# Altium footprint library ICPOWER.PcbLib: 71 footprints (part 3 of 5)
Each footprint in its own frame and in the unit in brackets; x right, y up, seen from the top. Pads: shape width x height; smd on the part's side, far side on the other; paste and mask are expansions set on the pad; w line width, h text height; cw(c..) or ccw(c..) is an arc to the next point about the centre after c.
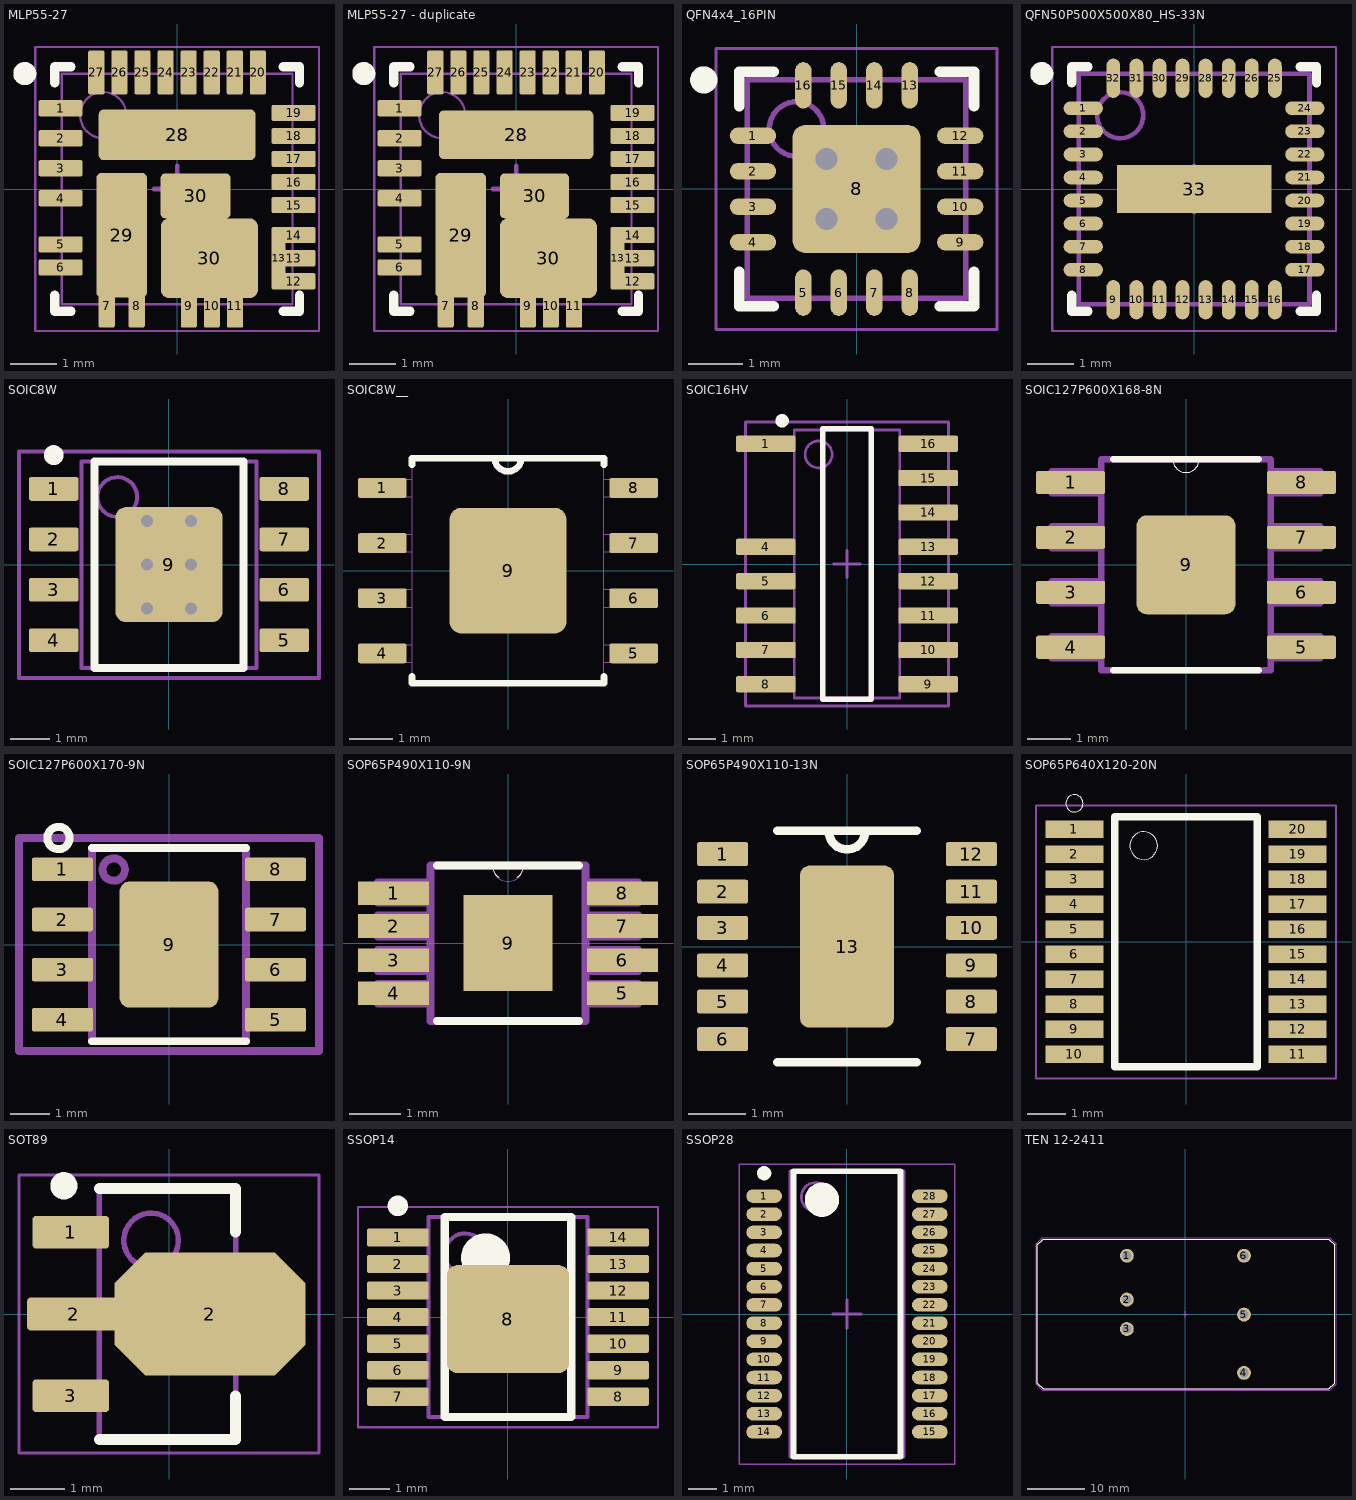
[diagram p2: the footprints below, top view; thin cyan lines are the x and y axes]

## MLP55-27 [mm] "SiC461, SiC462, SiC463, SiC464"
height 0.8
pads (32):
  rrect20% 0.95x0.35 smd: 1(-2.525,1.75) 2(-2.525,1.1) 3(-2.525,0.45) 4(-2.525,-0.2) 5(-2.525,-1.2) 6(-2.525,-1.7) 12(2.525,-2) 13(2.525,-1.5) 14(2.525,-1) 15(2.525,-0.35) 16(2.525,0.15) 17(2.525,0.65) 18(2.525,1.15) 19(2.525,1.65)
  rrect20% 0.35x0.95 smd: 7(-1.525,-2.525) 8(-0.875,-2.525) 9(0.255,-2.525) 10(0.755,-2.525) 11(1.255,-2.525) 20(1.75,2.525) 21(1.25,2.525) 22(0.75,2.525) 23(0.25,2.525) 24(-0.25,2.525) 25(-0.75,2.525) 26(-1.25,2.525) 27(-1.75,2.525)
  rrect20% 0.3x1.35 smd: 13(2.2,-1.5)
  rrect20% 3.4x1.1 smd: 28(0,1.175)
  rrect20% 1.1x2.7 smd: 29(-1.2,-1)
  rrect20% 1.52x0.97 smd: 30(0.4,-0.15)
  rrect20% 2.1x1.73 smd: 30(0.7,-1.5)
Top Overlay:
  circle w0.25: c-3.3,2.5 r0.125
  lines w0.2: -2.65,-2.3 -2.65,-2.65 -2.3,-2.65 ; -2.65,2.3 -2.65,2.65 -2.3,2.65 ; 2.3,-2.65 2.65,-2.65 2.65,-2.3 ; 2.3,2.65 2.65,2.65 2.65,2.3
Mechanical 13:
  circle w0.05: c-1.6,1.6 r0.5
  lines w0.05: -2.5,-2.5 2.5,-2.5 2.5,2.5 -2.5,2.5 -2.5,-2.5
Mechanical 15:
  lines w0.05: -3.075,-3.075 3.075,-3.075 3.075,3.075 -3.075,3.075 -3.075,-3.075
  lines w0.1: -0.5,0 0.5,0 ; 0,-0.5 0,0.5
3D body "QFN50P500X500X80_HS-33N.step": height 0.8, standoff 0, extent -2.55,-2.55 2.55,2.55

## MLP55-27 - duplicate [mm] "SiC461, SiC462, SiC463, SiC464"
height 0.8
pads (32):
  rrect20% 0.95x0.35 smd: 1(-2.525,1.75) 2(-2.525,1.1) 3(-2.525,0.45) 4(-2.525,-0.2) 5(-2.525,-1.2) 6(-2.525,-1.7) 12(2.525,-2) 13(2.525,-1.5) 14(2.525,-1) 15(2.525,-0.35) 16(2.525,0.15) 17(2.525,0.65) 18(2.525,1.15) 19(2.525,1.65)
  rrect20% 0.35x0.95 smd: 7(-1.525,-2.525) 8(-0.875,-2.525) 9(0.255,-2.525) 10(0.755,-2.525) 11(1.255,-2.525) 20(1.75,2.525) 21(1.25,2.525) 22(0.75,2.525) 23(0.25,2.525) 24(-0.25,2.525) 25(-0.75,2.525) 26(-1.25,2.525) 27(-1.75,2.525)
  rrect20% 0.3x1.35 smd: 13(2.2,-1.5)
  rrect20% 3.35x1.05 smd: 28(0,1.175)
  rrect20% 1.1x2.7 smd: 29(-1.2,-1)
  rrect20% 1.5x0.97 smd: 30(0.4,-0.15)
  rrect20% 2.1x1.73 smd: 30(0.7,-1.5)
Top Overlay:
  circle w0.25: c-3.3,2.5 r0.125
  lines w0.2: -2.65,-2.3 -2.65,-2.65 -2.3,-2.65 ; -2.65,2.3 -2.65,2.65 -2.3,2.65 ; 2.3,-2.65 2.65,-2.65 2.65,-2.3 ; 2.3,2.65 2.65,2.65 2.65,2.3
Mechanical 13:
  circle w0.05: c-1.6,1.6 r0.5
  lines w0.05: -2.5,-2.5 2.5,-2.5 2.5,2.5 -2.5,2.5 -2.5,-2.5
Mechanical 15:
  lines w0.05: -3.075,-3.075 3.075,-3.075 3.075,3.075 -3.075,3.075 -3.075,-3.075
  lines w0.1: -0.5,0 0.5,0 ; 0,-0.5 0,0.5
3D body "QFN50P500X500X80_HS-33N.step": height 0.8, standoff 0, extent -2.55,-2.55 2.55,2.55

## QFN4x4_16PIN [mm] "MIC68400"
height 0.85
pads (17):
  oval 0.85x0.3 smd: 1(-1.9,0.975) 2(-1.9,0.325) 3(-1.9,-0.325) 4(-1.9,-0.975) 9(1.9,-0.975) 10(1.9,-0.325) 11(1.9,0.325) 12(1.9,0.975)
  oval 0.3x0.85 smd: 5(-0.975,-1.9) 6(-0.325,-1.9) 7(0.325,-1.9) 8(0.975,-1.9) 13(0.975,1.9) 14(0.325,1.9) 15(-0.325,1.9) 16(-0.975,1.9)
  rrect20% 2.35x2.35 smd: 8(0,0)
via 0.55,-0.55 diameter 0.914 hole 0.406
via -0.55,-0.55 diameter 0.914 hole 0.406
via 0.55,0.55 diameter 0.914 hole 0.406
via -0.55,0.55 diameter 0.914 hole 0.406
Top Overlay:
  circle w0.25: c-2.8,2 r0.125
  lines w0.2: -2.15,-1.525 -2.15,-2.15 -1.525,-2.15 ; -2.15,1.525 -2.15,2.15 -1.525,2.15 ; 1.525,-2.15 2.15,-2.15 2.15,-1.525 ; 1.525,2.15 2.15,2.15 2.15,1.525
Mechanical 13:
  circle w0.1: c-1.1,1.1 r0.5
  lines w0.1: -2,-2 2,-2 2,2 -2,2 -2,-2
Mechanical 15:
  lines w0.05: -2.575,-2.575 2.575,-2.575 2.575,2.575 -2.575,2.575 -2.575,-2.575
  lines w0.1: -0.5,0 0.5,0 ; 0,-0.5 0,0.5
3D body "QFN4x4_16PIN.step": height 0.85, standoff 0, extent -2.05,-2.05 2.05,2.05

## QFN50P500X500X80_HS-33N [mm] "QFN, 32-Leads, Body 5,00x5,00mm, Pitch 0,50mm, Thermal Pad 3,35x1,05mm, IPC Medium Density"
height 0.8
pads (33):
  oval 0.85x0.3 smd: 1(-2.4,1.75) 2(-2.4,1.25) 3(-2.4,0.75) 4(-2.4,0.25) 5(-2.4,-0.25) 6(-2.4,-0.75) 7(-2.4,-1.25) 8(-2.4,-1.75) 17(2.4,-1.75) 18(2.4,-1.25) 19(2.4,-0.75) 20(2.4,-0.25) 21(2.4,0.25) 22(2.4,0.75) 23(2.4,1.25) 24(2.4,1.75)
  oval 0.3x0.85 smd: 9(-1.75,-2.4) 10(-1.25,-2.4) 11(-0.75,-2.4) 12(-0.25,-2.4) 13(0.25,-2.4) 14(0.75,-2.4) 15(1.25,-2.4) 16(1.75,-2.4) 25(1.75,2.4) 26(1.25,2.4) 27(0.75,2.4) 28(0.25,2.4) 29(-0.25,2.4) 30(-0.75,2.4) 31(-1.25,2.4) 32(-1.75,2.4)
  rect 3.35x1.05 smd: 33(0,0)
Top Overlay:
  circle w0.25: c-3.3,2.5 r0.125
  lines w0.2: -2.65,-2.3 -2.65,-2.65 -2.3,-2.65 ; -2.65,2.3 -2.65,2.65 -2.3,2.65 ; 2.3,-2.65 2.65,-2.65 2.65,-2.3 ; 2.3,2.65 2.65,2.65 2.65,2.3
Mechanical 13:
  circle w0.1: c-1.6,1.6 r0.5
  lines w0.1: -2.5,-2.5 -2.5,2.5 2.5,2.5 2.5,-2.5 -2.5,-2.5
Mechanical 15:
  lines w0.05: -3.075,-3.075 -3.075,3.075 3.075,3.075 3.075,-3.075 -3.075,-3.075
  lines w0.1: -0.5,0 0.5,0 ; 0,-0.5 0,0.5
3D body "QFN50P500X500X80_HS-33N.step": height 0.8, standoff 0, extent -2.55,-2.55 2.55,2.55

## SOIC8W [mm] "SOIC, 8-Leads, Body 5,20x4,40mm, Pitch 1,27mm, Thermal Pad 2,90x2,70mm, IPC Medium Density"
height 1.5
pads (9):
  rrect20% 1.25x0.6 smd: 1(-2.9,1.905) 2(-2.9,0.635) 3(-2.9,-0.635) 4(-2.9,-1.905) 5(2.9,-1.905) 6(2.9,-0.635) 7(2.9,0.635) 8(2.9,1.905)
  rrect20% 2.7x2.9 smd: 9(0,0)
via -0.55,1.1 diameter 0.7 hole 0.3
via 0.55,1.1 diameter 0.7 hole 0.3
via -0.55,0 diameter 0.7 hole 0.3
via 0.55,0 diameter 0.7 hole 0.3
via -0.55,-1.1 diameter 0.7 hole 0.3
via 0.55,-1.1 diameter 0.7 hole 0.3
Top Overlay:
  circle w0.25: c-2.9,2.755 r0.125
  lines w0.2: -1.875,-2.6 -1.875,2.6 1.875,2.6 1.875,-2.6 -1.875,-2.6
M3_comm_top:
  text ".comment" at -1.2,-0.4 h1
M5_asm_top:
  circle w0.1: c-1.3,1.7 r0.5
  lines w0.1: -2.2,-2.6 2.2,-2.6 2.2,2.6 -2.2,2.6 -2.2,-2.6
  text ".Designator" at -1.6,2.9 h1
M7_courtyard_top:
  lines w0.1: -0.5,0 0.5,0 ; 0,-0.5 0,0.5 ; -3.775,-2.85 3.775,-2.85 3.775,2.85 -3.775,2.85 -3.775,-2.85
3D body "SOIC8W_.step": height 1.5, standoff 0, extent -3.1,-2.6 3.1,2.6

## SOIC8W__ [mil] "SI-8005Q"
pads (9):
  rrect20% 44x18 smd: 1(-114,75) 2(-114,25) 3(-114,-25) 4(-114,-75) 5(114,-75) 6(114,-25) 7(114,25) 8(114,75)
  rrect20% 106x114 smd: 9(0,0)
Top Overlay:
  lines w6: -87,-96 -87,-102 87,-102 87,-96 ; -87,96 -87,102 -12,102 ; 87,96 87,102 12,102 ; -12,102 ccw(c0,102) 12,102 ; -12,102 12,102
M1_3D_TOP:
  lines w0: -12,102 ccw(c0,102) 12,102 ; -12,102 -87,102 -87,-102 87,-102 87,102 12,102 ; -12,102 12,102 ; -122,-83 -87,-83 -87,-67 -122,-67 -122,-83 ; -122,-33 -87,-33 -87,-17 -122,-17 -122,-33 ; -122,17 -87,17 -87,33 -122,33 -122,17 ; -122,67 -87,67 -87,83 -122,83 -122,67 ; 87,-83 122,-83 122,-67 87,-67 87,-83 ; 87,-33 122,-33 122,-17 87,-17 87,-33 ; 87,17 122,17 122,33 87,33 87,17 ; 87,67 122,67 122,83 87,83 87,67

## SOIC16HV [mm] "HV9120NG"
height 1.75
pads (14):
  rrect20% 2.2x0.6 smd: 1(-3,4.445) 4(-3,0.635) 5(-3,-0.635) 6(-3,-1.905) 7(-3,-3.175) 8(-3,-4.445) 9(3,-4.445) 10(3,-3.175) 11(3,-1.905) 12(3,-0.635) 13(3,0.635) 14(3,1.905) 15(3,3.175) 16(3,4.445)
Top Overlay:
  circle w0.25: c-2.4,5.295 r0.125
  lines w0.2: -0.9,-5 0.9,-5 0.9,5 -0.9,5 -0.9,-5
M3_comm_top:
  text ".comment" at -3,-0.5 h2
M5_asm_top:
  text ".Designator" at -2,5.5 h2
M7_courtyard_top:
  lines w0.1: -0.5,0 0.5,0 ; 0,-0.5 0,0.5 ; -3.75,-5.25 -3.75,5.25 3.75,5.25 3.75,-5.25 -3.75,-5.25
Mechanical 13:
  circle w0.1: c-1.05,4.05 r0.5
  lines w0.1: -1.95,-4.95 -1.95,4.95 1.95,4.95 1.95,-4.95 -1.95,-4.95
3D body "SOIC127P600X175-16N.stp": height 1.75, standoff 0, extent -3.1,-5 3.1,5

## SOIC127P600X168-8N [mil]
pads (9):
  rrect20% 63x21 smd: 1(-105,75) 2(-105,25) 3(-105,-25) 4(-105,-75) 5(105,-75) 6(105,-25) 7(105,25) 8(105,75)
  rrect20% 90x90 smd: 9(0,0)
Top Overlay:
  lines w0: -12,96 ccw(c0,96) 12,96
  lines w6: -66,-96 66,-96 ; -66,96 -12,96 12,96 66,96
M1_3D_TOP:
  lines w0: -12,96 ccw(c0,96) 12,96
  lines w6: -122,-85 -77,-85 -77,-65 -122,-65 -122,-85 ; -122,-35 -77,-35 -77,-15 -122,-15 -122,-35 ; -122,15 -77,15 -77,35 -122,35 -122,15 ; -122,65 -77,65 -77,85 -122,85 -122,65 ; -77,-96 -77,96 -12,96 12,96 77,96 77,-96 -77,-96 ; 77,-85 122,-85 122,-65 77,-65 77,-85 ; 77,-35 122,-35 122,-15 77,-15 77,-35 ; 77,15 122,15 122,35 77,35 77,15 ; 77,65 122,65 122,85 77,85 77,65
3D body "SOIC-8-1.step": height 68.9, standoff 0, extent -118.1,-96.46 118.12,96.46

## SOIC127P600X170-9N [mm]
pads (9):
  rrect20% 1.55x0.6 smd: 1(-2.7,1.905) 2(-2.7,0.635) 3(-2.7,-0.635) 4(-2.7,-1.905) 5(2.7,-1.905) 6(2.7,-0.635) 7(2.7,0.635) 8(2.7,1.905)
  rrect20% 2.5x3.2 smd: 9(0,0)
Top Overlay:
  circle w0.2: c-2.8,2.7 r0.283
  lines w0.2: -1.95,-2.45 1.95,-2.45 ; -1.95,2.45 1.95,2.45
Top Paste:
  region: -0.742,1.09 0.74,1.09 0.74,-1.093 -0.742,-1.093
M3_comm_top:
  text ".comment" at -0.9,-0.3 h1
M5_asm_top:
  circle w0.2: c-1.4,1.9 r0.283
  lines w0.2: -1.95,-2.45 1.95,-2.45 ; -1.95,-2.45 -1.95,2.45 ; -1.95,-2.45 -1.95,2.45 ; -1.95,2.45 1.95,2.45 ; 1.95,-2.45 1.95,2.45 ; 1.95,-2.45 1.95,2.45
  text ".Designator" at -1.7,2.9 h1
M7_courtyard_top:
  lines w0.2: -0.5,0 0.5,0 ; 0,-0.5 0,0.5 ; -3.8,-2.7 -3.8,2.7 3.8,2.7 3.8,-2.7 -3.8,-2.7
Mechanical 16:
  lines w0.05: -3.75,-2.7 -3.75,2.75 3.75,2.75 3.75,-2.7 -3.75,-2.7
3D body "SOIC-8-1.step": height 1.75, standoff 0, extent -3,-2.45 3,2.45

## SOP65P490X110-9N [mil]
pads (9):
  rect 54x18 smd: 1(-87,38) 2(-87,13) 3(-87,-13) 4(-87,-38) 5(87,-38) 6(87,-13) 7(87,13) 8(87,38)
  rect 68x73 smd: 9(0,0)
Top Overlay:
  lines w0: -12,59.01 ccw(c-0.27,59.63) -7.01,50.01 ; 7.01,50.01 ccw(c0.27,59.63) 12,59.01
  lines w6: -54,-59 54,-59 ; -54,59 -12,59 12,59 54,59
M1_3D_TOP:
  lines w0: -12,59 ccw(c0,59) 12,59
  lines w6: -99,-46 -99,-31 -59,-31 -59,-46 -99,-46 ; -99,-21 -99,-5 -59,-5 -59,-21 -99,-21 ; -99,5 -99,21 -59,21 -59,5 -99,5 ; -99,31 -99,46 -59,46 -59,31 -99,31 ; -59,-59 -59,59 -12,59 12,59 59,59 59,-59 -59,-59 ; 59,-46 59,-31 99,-31 99,-46 59,-46 ; 59,-21 59,-5 99,-5 99,-21 59,-21 ; 59,5 59,21 99,21 99,5 59,5 ; 59,31 59,46 99,46 99,31 59,31

## SOP65P490X110-13N [mil]
pads (13):
  rrect20% 35.43x16.54 smd: 1(-86,64) 2(-86,38) 3(-86,13) 4(-86,-13) 5(-86,-38) 6(-86,-64) 7(86,-64) 8(86,-38) 9(86,-13) 10(86,13) 11(86,38) 12(86,64)
  rrect20% 65x112 smd: 13(0,0)
Top Overlay:
  lines w6: -48,-80 48,-80 ; -48,80 -12,80 12,80 48,80 ; -12.53,79.93 ccw(c0,79.7) 12.53,79.91

## SOP65P640X120-20N [mm]
pads (20):
  rect 1.5x0.45 smd: 1(-2.9,2.925) 2(-2.9,2.275) 3(-2.9,1.625) 4(-2.9,0.975) 5(-2.9,0.325) 6(-2.9,-0.325) 7(-2.9,-0.975) 8(-2.9,-1.625) 9(-2.9,-2.275) 10(-2.9,-2.925) 11(2.9,-2.925) 12(2.9,-2.275) 13(2.9,-1.625) 14(2.9,-0.975) 15(2.9,-0.325) 16(2.9,0.325) 17(2.9,0.975) 18(2.9,1.625) 19(2.9,2.275) 20(2.9,2.925)
Top Overlay:
  circle w0: c-2.9,3.6 r0.224
  circle w0: c-1.1,2.5 r0.361
  lines w0.2: -1.85,-3.25 -1.85,3.25 1.85,3.25 1.85,-3.25 -1.85,-3.25
M1_3D_TOP:
  lines w0.05: -3.9,-3.55 -3.9,3.55 3.9,3.55 3.9,-3.55 -3.9,-3.55

## SOT89 [mm] "SOT89, 3-Leads, Body 4,50x2,50mm, Pitch 1,50mm, Lead Span 4,1mm, IPC Medium Density"
height 1.6
pads (4):
  rrect20% 1.4x0.6 smd: 1(-1.8,1.5) 3(-1.8,-1.5)
  rrect20% 1.7x0.6 smd: 2(-1.75,0)
  oct 3.5x2.25 smd: 2(0.75,0)
Top Overlay:
  circle w0.25: c-1.928,2.35 r0.125
  lines w0.2: -1.278,-2.3 1.222,-2.3 1.222,-1.5 ; -1.278,2.3 1.222,2.3 1.222,1.5
M3_comm_top:
  text ".comment" at -0.9,-0.3 h1
M5_asm_top:
  circle w0.1: c-0.328,1.35 r0.5
  lines w0.1: -1.278,-2.3 1.222,-2.3 1.222,2.3 -1.278,2.3 -1.278,-2.3
  text ".Designator" at -1,1.3 h1
M7_courtyard_top:
  lines w0.05: -2.75,-2.55 2.75,-2.55 2.75,2.55 -2.75,2.55 -2.75,-2.55
  lines w0.1: -0.5,0 0.5,0 ; 0,-0.5 0,0.5
3D body "SOT89.step": height 1.6, standoff 0, extent -2.15,-2.297 2.05,2.297

## SSOP14 [mm] "SOP, 14-Leads, Body 4,90x3,90mm, Pitch 0,65mm, Thermal Pad 0,00x0,00mm, IPC Medium Density"
height 1.7
pads (15):
  rrect20% 1.5x0.45 smd: 1(-2.7,1.95) 2(-2.7,1.3) 3(-2.7,0.65) 4(-2.7,0) 5(-2.7,-0.65) 6(-2.7,-1.3) 7(-2.7,-1.95) 8(2.7,-1.95) 9(2.7,-1.3) 10(2.7,-0.65) 11(2.7,0) 12(2.7,0.65) 13(2.7,1.3) 14(2.7,1.95)
  rrect20% 3x2.65 smd: 8(0,-0.05)
Top Overlay:
  circle w0.6: c-0.55,1.45 r0.3
  circle w0.25: c-2.7,2.725 r0.125
  lines w0.2: -1.55,-2.45 1.55,-2.45 1.55,2.45 -1.55,2.45 -1.55,-2.45
Mechanical 13:
  circle w0.1: c-1.05,1.55 r0.5
  lines w0.1: -1.95,-2.45 1.95,-2.45 1.95,2.45 -1.95,2.45 -1.95,-2.45
Mechanical 15:
  lines w0.05: -3.675,-2.7 3.675,-2.7 3.675,2.7 -3.675,2.7 -3.675,-2.7
  lines w0.1: -0.5,0 0.5,0 ; 0,-0.5 0,0.5
3D body "SSOP14.step": height 1.7, standoff 0, extent -3,-2.45 3,2.45

## SSOP28 [mm] "SOP, 28-Leads, IPC Medium Density"
height 1.75
pads (28):
  oval 1.25x0.475 smd: 1(-2.9,4.127) 2(-2.9,3.492) 3(-2.9,2.857) 4(-2.9,2.222) 5(-2.9,1.587) 6(-2.9,0.953) 7(-2.9,0.318) 8(-2.9,-0.318) 9(-2.9,-0.953) 10(-2.9,-1.587) 11(-2.9,-2.222) 12(-2.9,-2.857) 13(-2.9,-3.492) 14(-2.9,-4.127) 15(2.9,-4.127) 16(2.9,-3.492) 17(2.9,-2.857) 18(2.9,-2.222) 19(2.9,-1.587) 20(2.9,-0.953) 21(2.9,-0.318) 22(2.9,0.318) 23(2.9,0.953) 24(2.9,1.587) 25(2.9,2.222) 26(2.9,2.857) 27(2.9,3.492) 28(2.9,4.127)
Top Overlay:
  circle w0.25: c-2.9,4.928 r0.125
  circle w0.6: c-0.875,4 r0.3
  lines w0.2: -1.875,-5 -1.875,5 1.875,5 1.875,-5 -1.875,-5
Mechanical 13:
  circle w0.1: c-1.1,4.1 r0.5
  lines w0.1: -2,-5 -2,5 2,5 2,-5 -2,-5
Mechanical 15:
  lines w0.05: -3.775,-5.25 -3.775,5.25 3.775,5.25 3.775,-5.25 -3.775,-5.25
  lines w0.1: -0.5,0 0.5,0 ; 0,-0.5 0,0.5
3D body "SSOP28_LTC.STEP": height 1.75, standoff 0, extent -3.094,-4.991 3.094,4.991

## TEN 12-2411 [mm] "TEN 12-2411"
height 12.5
pads (6):
  round 2.4 hole 1.6: 1(-10.15,10.15) 2(-10.15,2.55) 3(-10.15,-2.55) 4(10.15,-10.15) 5(10.15,-0.05) 6(10.15,10.15)
Top Overlay:
  lines w0.2: -25.65,-11.95 -24.65,-12.95 24.85,-12.95 25.85,-11.95 25.85,12.05 24.85,13.05 -24.65,13.05 -25.65,12.05 -25.65,-11.95
M3_comm_top:
  text ".comment" at -0.9,-0.3 h1
M5_asm_top:
  lines w0.2: -25.65,-11.95 -25.65,12.05 -24.65,13.05 24.85,13.05 25.85,12.05 25.85,-11.95 24.85,-12.95 -24.65,-12.95 -25.65,-11.95
  text ".Designator" at -1,1.3 h1
M7_courtyard_top:
  lines w0.2: -0.5,0 0.5,0 ; 0,-0.5 0,0.5 ; -25.9,-12.1 -24.8,-13.2 25,-13.2 26.1,-12.1 26.1,12.2 25,13.3 -24.8,13.3 -25.9,12.2 -25.9,-12.1
3D body "ten12wi.stp": height 10.3, standoff -5.9, extent -25.4,-12.7 25.4,12.7